# Altium footprint library 排针-排母-1.27.PcbLib: 152 footprints (part 7 of 10)
Each footprint in its own frame and in the unit in brackets; x right, y up, seen from the top. Pads: shape width x height; smd on the part's side, far side on the other; paste and mask are expansions set on the pad; w line width, h text height; cw(c..) or ccw(c..) is an arc to the next point about the centre after c.
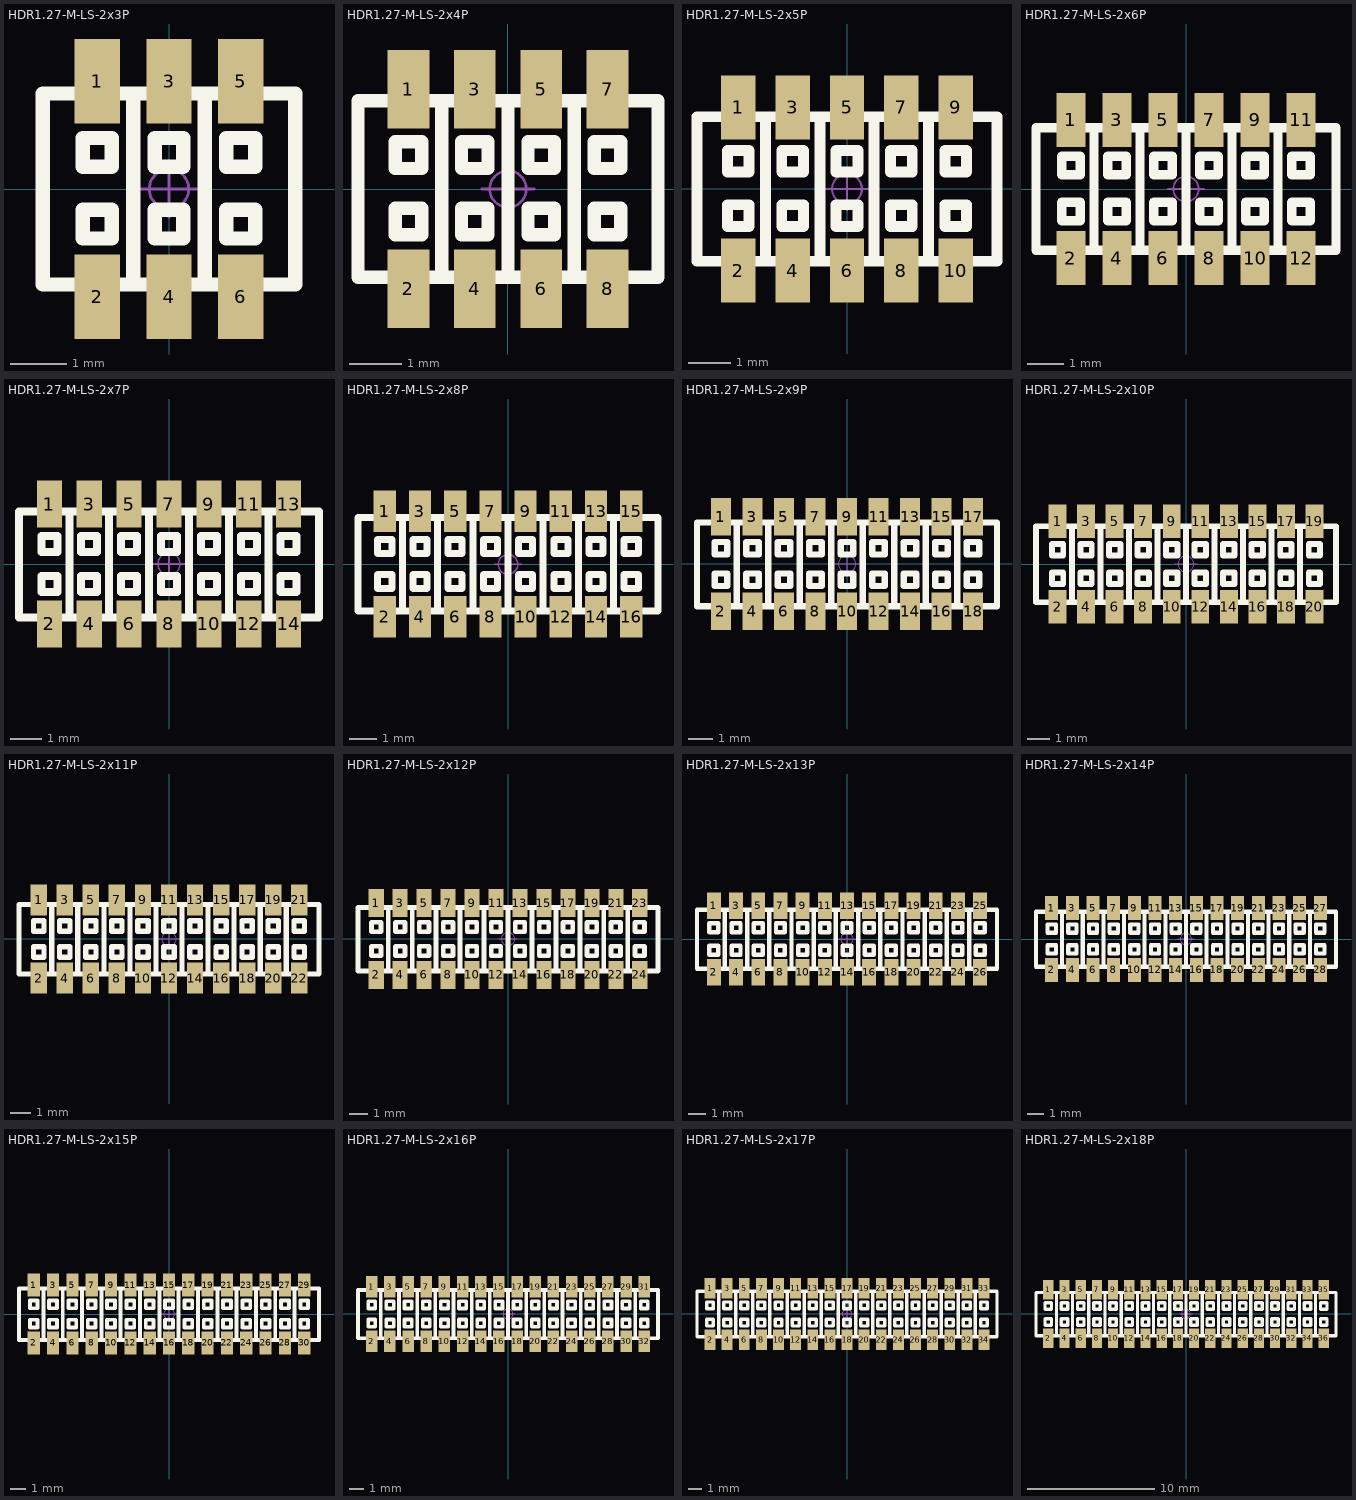
[diagram p6: the footprints below, top view; thin cyan lines are the x and y axes]

## HDR1.27-M-LS-2x3P [mm] "双排贴片排母，脚距：1.27mm"
pads (6):
  rect 0.8x1.5 smd: 1(-1.27,1.905) 2(-1.27,-1.905) 3(0,1.905) 4(0,-1.905) 5(1.27,1.905) 6(1.27,-1.905)
Top Overlay:
  lines w0.254: -0.635,-1.689 -0.635,1.689 ; 0.635,-1.689 0.635,1.689 ; -2.235,-1.689 -2.235,1.689 2.235,1.689 2.235,-1.689 -2.235,-1.689 ; -1.524,-0.876 -1.016,-0.876 -1.016,-0.368 -1.524,-0.368 -1.524,-0.876 ; -1.524,0.394 -1.524,0.902 -1.016,0.902 -1.016,0.394 -1.524,0.394 ; -0.254,-0.876 -0.254,-0.368 0.254,-0.368 0.254,-0.876 -0.254,-0.876 ; -0.254,0.394 0.254,0.394 0.254,0.902 -0.254,0.902 -0.254,0.394 ; 1.016,-0.876 1.524,-0.876 1.524,-0.368 1.016,-0.368 1.016,-0.876 ; 1.016,0.394 1.016,0.902 1.524,0.902 1.524,0.394 1.016,0.394
Mechanical 15:
  circle w0.05: c0,0 r0.35
  lines w0.05: -0.5,0 0.5,0 ; 0,-0.5 0,0.5
3D body: height 4.67, standoff 0, extent -0.635,-2.4 0.635,2.4
3D body: height 4.67, standoff 0, extent -2.105,-2.4 -0.635,2.4
3D body: height 4.67, standoff 0, extent 0.635,-2.4 2.105,2.4

## HDR1.27-M-LS-2x4P [mm] "双排贴片排母，脚距：1.27mm"
pads (8):
  rect 0.8x1.5 smd: 1(-1.905,1.905) 2(-1.905,-1.905) 3(-0.635,1.905) 4(-0.635,-1.905) 5(0.635,1.905) 6(0.635,-1.905) 7(1.905,1.905) 8(1.905,-1.905)
Top Overlay:
  lines w0.254: -1.27,-1.689 -1.27,1.689 ; 0,-1.689 0,1.689 ; 1.27,-1.689 1.27,1.689 ; -2.87,-1.689 -2.87,1.689 2.87,1.689 2.87,-1.689 -2.87,-1.689 ; -2.159,-0.876 -1.651,-0.876 -1.651,-0.368 -2.159,-0.368 -2.159,-0.876 ; -2.159,0.394 -2.159,0.902 -1.651,0.902 -1.651,0.394 -2.159,0.394 ; -0.889,-0.876 -0.889,-0.368 -0.381,-0.368 -0.381,-0.876 -0.889,-0.876 ; -0.889,0.394 -0.381,0.394 -0.381,0.902 -0.889,0.902 -0.889,0.394 ; 0.381,-0.876 0.381,-0.368 0.889,-0.368 0.889,-0.876 0.381,-0.876 ; 0.381,0.394 0.889,0.394 0.889,0.902 0.381,0.902 0.381,0.394 ; 1.651,-0.876 1.651,-0.368 2.159,-0.368 2.159,-0.876 1.651,-0.876 ; 1.651,0.394 2.159,0.394 2.159,0.902 1.651,0.902 1.651,0.394
Mechanical 15:
  circle w0.05: c0,0 r0.35
  lines w0.05: -0.5,0 0.5,0 ; 0,-0.5 0,0.5
3D body: height 4.67, standoff 0, extent 0,-2.4 1.27,2.4
3D body: height 4.67, standoff 0, extent -1.27,-2.4 0,2.4
3D body: height 4.67, standoff 0, extent -2.74,-2.4 -1.27,2.4
3D body: height 4.67, standoff 0, extent 1.27,-2.4 2.74,2.4

## HDR1.27-M-LS-2x5P [mm] "双排贴片排母，脚距：1.27mm"
pads (10):
  rect 0.8x1.5 smd: 1(-2.54,1.905) 2(-2.54,-1.905) 3(-1.27,1.905) 4(-1.27,-1.905) 5(0,1.905) 6(0,-1.905) 7(1.27,1.905) 8(1.27,-1.905) 9(2.54,1.905) 10(2.54,-1.905)
Top Overlay:
  lines w0.254: -1.905,-1.689 -1.905,1.689 ; -0.635,-1.689 -0.635,1.689 ; 0.635,-1.689 0.635,1.689 ; 1.905,-1.689 1.905,1.689 ; -3.505,-1.689 -3.505,1.689 3.505,1.689 3.505,-1.689 -3.505,-1.689 ; -2.794,-0.876 -2.286,-0.876 -2.286,-0.368 -2.794,-0.368 -2.794,-0.876 ; -2.794,0.394 -2.794,0.902 -2.286,0.902 -2.286,0.394 -2.794,0.394 ; -1.524,-0.876 -1.524,-0.368 -1.016,-0.368 -1.016,-0.876 -1.524,-0.876 ; -1.524,0.394 -1.016,0.394 -1.016,0.902 -1.524,0.902 -1.524,0.394 ; -0.254,-0.876 -0.254,-0.368 0.254,-0.368 0.254,-0.876 -0.254,-0.876 ; -0.254,0.394 0.254,0.394 0.254,0.902 -0.254,0.902 -0.254,0.394 ; 1.016,-0.876 1.016,-0.368 1.524,-0.368 1.524,-0.876 1.016,-0.876 ; 1.016,0.394 1.524,0.394 1.524,0.902 1.016,0.902 1.016,0.394 ; 2.286,-0.876 2.286,-0.368 2.794,-0.368 2.794,-0.876 2.286,-0.876 ; 2.286,0.394 2.794,0.394 2.794,0.902 2.286,0.902 2.286,0.394
Mechanical 15:
  circle w0.05: c0,0 r0.35
  lines w0.05: -0.5,0 0.5,0 ; 0,-0.5 0,0.5
3D body: height 4.67, standoff 0, extent -3.375,-2.4 -1.905,2.4
3D body: height 4.67, standoff 0, extent 1.905,-2.4 3.375,2.4
3D body: height 4.67, standoff 0, extent -1.905,-2.4 -0.635,2.4
3D body: height 4.67, standoff 0, extent -0.635,-2.4 0.635,2.4
3D body: height 4.67, standoff 0, extent 0.635,-2.4 1.905,2.4

## HDR1.27-M-LS-2x6P [mm] "双排贴片排母，脚距：1.27mm"
pads (12):
  rect 0.8x1.5 smd: 1(-3.175,1.905) 2(-3.175,-1.905) 3(-1.905,1.905) 4(-1.905,-1.905) 5(-0.635,1.905) 6(-0.635,-1.905) 7(0.635,1.905) 8(0.635,-1.905) 9(1.905,1.905) 10(1.905,-1.905) 11(3.175,1.905) 12(3.175,-1.905)
Top Overlay:
  lines w0.254: -2.54,-1.689 -2.54,1.689 ; -1.27,-1.689 -1.27,1.689 ; 0,-1.689 0,1.689 ; 1.27,-1.689 1.27,1.689 ; 2.54,-1.689 2.54,1.689 ; -4.14,-1.689 4.14,-1.689 4.14,1.689 -4.14,1.689 -4.14,-1.689 ; -3.429,-0.876 -3.429,-0.368 -2.921,-0.368 -2.921,-0.876 -3.429,-0.876 ; -3.429,0.394 -2.921,0.394 -2.921,0.902 -3.429,0.902 -3.429,0.394 ; -2.159,-0.876 -1.651,-0.876 -1.651,-0.368 -2.159,-0.368 -2.159,-0.876 ; -2.159,0.394 -2.159,0.902 -1.651,0.902 -1.651,0.394 -2.159,0.394 ; -0.889,-0.876 -0.381,-0.876 -0.381,-0.368 -0.889,-0.368 -0.889,-0.876 ; -0.889,0.394 -0.889,0.902 -0.381,0.902 -0.381,0.394 -0.889,0.394 ; 0.381,-0.876 0.889,-0.876 0.889,-0.368 0.381,-0.368 0.381,-0.876 ; 0.381,0.394 0.381,0.902 0.889,0.902 0.889,0.394 0.381,0.394 ; 1.651,-0.876 2.159,-0.876 2.159,-0.368 1.651,-0.368 1.651,-0.876 ; 1.651,0.394 1.651,0.902 2.159,0.902 2.159,0.394 1.651,0.394 ; 2.921,-0.876 3.429,-0.876 3.429,-0.368 2.921,-0.368 2.921,-0.876 ; 2.921,0.394 2.921,0.902 3.429,0.902 3.429,0.394 2.921,0.394
Mechanical 15:
  circle w0.05: c0,0 r0.35
  lines w0.05: -0.5,0 0.5,0 ; 0,-0.5 0,0.5
3D body: height 4.67, standoff 0, extent 2.54,-2.4 4.01,2.4
3D body: height 4.67, standoff 0, extent -4.01,-2.4 -2.54,2.4
3D body: height 4.67, standoff 0, extent -2.54,-2.4 -1.27,2.4
3D body: height 4.67, standoff 0, extent -1.27,-2.4 0,2.4
3D body: height 4.67, standoff 0, extent 0,-2.4 1.27,2.4
3D body: height 4.67, standoff 0, extent 1.27,-2.4 2.54,2.4

## HDR1.27-M-LS-2x7P [mm] "双排贴片排母，脚距：1.27mm"
pads (14):
  rect 0.8x1.5 smd: 1(-3.81,1.918) 2(-3.81,-1.892) 3(-2.54,1.918) 4(-2.54,-1.892) 5(-1.27,1.918) 6(-1.27,-1.892) 7(0,1.918) 8(0,-1.892) 9(1.27,1.918) 10(1.27,-1.892) 11(2.54,1.918) 12(2.54,-1.892) 13(3.81,1.918) 14(3.81,-1.892)
Top Overlay:
  lines w0.254: -3.175,-1.689 -3.175,1.689 ; -1.905,-1.689 -1.905,1.689 ; -0.635,-1.689 -0.635,1.689 ; 0.635,-1.689 0.635,1.689 ; 1.905,-1.689 1.905,1.689 ; 3.175,-1.689 3.175,1.689 ; -4.775,-1.689 4.775,-1.689 4.775,1.689 -4.775,1.689 -4.775,-1.689 ; -4.064,-0.876 -4.064,-0.368 -3.556,-0.368 -3.556,-0.876 -4.064,-0.876 ; -4.064,0.394 -3.556,0.394 -3.556,0.902 -4.064,0.902 -4.064,0.394 ; -2.794,-0.876 -2.286,-0.876 -2.286,-0.368 -2.794,-0.368 -2.794,-0.876 ; -2.794,0.394 -2.794,0.902 -2.286,0.902 -2.286,0.394 -2.794,0.394 ; -1.524,-0.876 -1.016,-0.876 -1.016,-0.368 -1.524,-0.368 -1.524,-0.876 ; -1.524,0.394 -1.524,0.902 -1.016,0.902 -1.016,0.394 -1.524,0.394 ; -0.254,-0.876 0.254,-0.876 0.254,-0.368 -0.254,-0.368 -0.254,-0.876 ; -0.254,0.394 -0.254,0.902 0.254,0.902 0.254,0.394 -0.254,0.394 ; 1.016,-0.876 1.524,-0.876 1.524,-0.368 1.016,-0.368 1.016,-0.876 ; 1.016,0.394 1.016,0.902 1.524,0.902 1.524,0.394 1.016,0.394 ; 2.286,-0.876 2.794,-0.876 2.794,-0.368 2.286,-0.368 2.286,-0.876 ; 2.286,0.394 2.286,0.902 2.794,0.902 2.794,0.394 2.286,0.394 ; 3.556,-0.876 4.064,-0.876 4.064,-0.368 3.556,-0.368 3.556,-0.876 ; 3.556,0.394 3.556,0.902 4.064,0.902 4.064,0.394 3.556,0.394
Mechanical 15:
  circle w0.05: c0,0.013 r0.35
  lines w0.05: -0.5,0.013 0.5,0.013 ; 0,-0.487 0,0.513
3D body: height 4.67, standoff 0, extent 1.905,-2.387 3.175,2.413
3D body: height 4.67, standoff 0, extent 0.635,-2.387 1.905,2.413
3D body: height 4.67, standoff 0, extent -0.635,-2.387 0.635,2.413
3D body: height 4.67, standoff 0, extent -1.905,-2.387 -0.635,2.413
3D body: height 4.67, standoff 0, extent -3.175,-2.387 -1.905,2.413
3D body: height 4.67, standoff 0, extent -4.645,-2.387 -3.175,2.413
3D body: height 4.67, standoff 0, extent 3.175,-2.387 4.645,2.413

## HDR1.27-M-LS-2x8P [mm] "双排贴片排母，脚距：1.27mm"
pads (16):
  rect 0.8x1.5 smd: 1(-4.445,1.918) 2(-4.445,-1.892) 3(-3.175,1.918) 4(-3.175,-1.892) 5(-1.905,1.918) 6(-1.905,-1.892) 7(-0.635,1.918) 8(-0.635,-1.892) 9(0.635,1.918) 10(0.635,-1.892) 11(1.905,1.918) 12(1.905,-1.892) 13(3.175,1.918) 14(3.175,-1.892) 15(4.445,1.918) 16(4.445,-1.892)
Top Overlay:
  lines w0.254: -3.81,-1.689 -3.81,1.689 ; -2.54,-1.689 -2.54,1.689 ; -1.27,-1.689 -1.27,1.689 ; 0,-1.689 0,1.689 ; 1.27,-1.689 1.27,1.689 ; 2.54,-1.689 2.54,1.689 ; 3.81,-1.689 3.81,1.689 ; -5.41,-1.689 5.41,-1.689 5.41,1.689 -5.41,1.689 -5.41,-1.689 ; -4.699,-0.876 -4.699,-0.368 -4.191,-0.368 -4.191,-0.876 -4.699,-0.876 ; -4.699,0.394 -4.191,0.394 -4.191,0.902 -4.699,0.902 -4.699,0.394 ; -3.429,-0.876 -2.921,-0.876 -2.921,-0.368 -3.429,-0.368 -3.429,-0.876 ; -3.429,0.394 -3.429,0.902 -2.921,0.902 -2.921,0.394 -3.429,0.394 ; -2.159,-0.876 -1.651,-0.876 -1.651,-0.368 -2.159,-0.368 -2.159,-0.876 ; -2.159,0.394 -2.159,0.902 -1.651,0.902 -1.651,0.394 -2.159,0.394 ; -0.889,-0.876 -0.381,-0.876 -0.381,-0.368 -0.889,-0.368 -0.889,-0.876 ; -0.889,0.394 -0.889,0.902 -0.381,0.902 -0.381,0.394 -0.889,0.394 ; 0.381,-0.876 0.889,-0.876 0.889,-0.368 0.381,-0.368 0.381,-0.876 ; 0.381,0.394 0.381,0.902 0.889,0.902 0.889,0.394 0.381,0.394 ; 1.651,-0.876 2.159,-0.876 2.159,-0.368 1.651,-0.368 1.651,-0.876 ; 1.651,0.394 1.651,0.902 2.159,0.902 2.159,0.394 1.651,0.394 ; 2.921,-0.876 3.429,-0.876 3.429,-0.368 2.921,-0.368 2.921,-0.876 ; 2.921,0.394 2.921,0.902 3.429,0.902 3.429,0.394 2.921,0.394 ; 4.191,-0.876 4.699,-0.876 4.699,-0.368 4.191,-0.368 4.191,-0.876 ; 4.191,0.394 4.191,0.902 4.699,0.902 4.699,0.394 4.191,0.394
Mechanical 15:
  circle w0.05: c0,0 r0.35
  lines w0.05: -0.5,0 0.5,0 ; 0,-0.5 0,0.5
3D body: height 4.67, standoff 0, extent 2.54,-2.387 3.81,2.413
3D body: height 4.67, standoff 0, extent 1.27,-2.387 2.54,2.413
3D body: height 4.67, standoff 0, extent 0,-2.387 1.27,2.413
3D body: height 4.67, standoff 0, extent -1.27,-2.387 0,2.413
3D body: height 4.67, standoff 0, extent -2.54,-2.387 -1.27,2.413
3D body: height 4.67, standoff 0, extent -3.81,-2.387 -2.54,2.413
3D body: height 4.67, standoff 0, extent 3.81,-2.387 5.28,2.413
3D body: height 4.67, standoff 0, extent -5.28,-2.387 -3.81,2.413

## HDR1.27-M-LS-2x9P [mm] "双排贴片排母，脚距：1.27mm"
pads (18):
  rect 0.8x1.5 smd: 1(-5.08,1.905) 2(-5.08,-1.905) 3(-3.81,1.905) 4(-3.81,-1.905) 5(-2.54,1.905) 6(-2.54,-1.905) 7(-1.27,1.905) 8(-1.27,-1.905) 9(0,1.905) 10(0,-1.905) 11(1.27,1.905) 12(1.27,-1.905) 13(2.54,1.905) 14(2.54,-1.905) 15(3.81,1.905) 16(3.81,-1.905) 17(5.08,1.905) 18(5.08,-1.905)
Top Overlay:
  lines w0.254: -4.445,-1.702 -4.445,1.676 ; -3.175,-1.702 -3.175,1.676 ; -1.905,-1.702 -1.905,1.676 ; -0.635,-1.702 -0.635,1.676 ; 0.635,-1.702 0.635,1.676 ; 1.905,-1.702 1.905,1.676 ; 3.175,-1.702 3.175,1.676 ; 4.445,-1.702 4.445,1.676 ; -6.045,-1.702 -6.045,1.676 6.045,1.676 6.045,-1.702 -6.045,-1.702 ; -5.334,-0.889 -4.826,-0.889 -4.826,-0.381 -5.334,-0.381 -5.334,-0.889 ; -5.334,0.381 -5.334,0.889 -4.826,0.889 -4.826,0.381 -5.334,0.381 ; -4.064,-0.889 -4.064,-0.381 -3.556,-0.381 -3.556,-0.889 -4.064,-0.889 ; -4.064,0.381 -3.556,0.381 -3.556,0.889 -4.064,0.889 -4.064,0.381 ; -2.794,-0.889 -2.794,-0.381 -2.286,-0.381 -2.286,-0.889 -2.794,-0.889 ; -2.794,0.381 -2.286,0.381 -2.286,0.889 -2.794,0.889 -2.794,0.381 ; -1.524,-0.889 -1.524,-0.381 -1.016,-0.381 -1.016,-0.889 -1.524,-0.889 ; -1.524,0.381 -1.016,0.381 -1.016,0.889 -1.524,0.889 -1.524,0.381 ; -0.254,-0.889 -0.254,-0.381 0.254,-0.381 0.254,-0.889 -0.254,-0.889 ; -0.254,0.381 0.254,0.381 0.254,0.889 -0.254,0.889 -0.254,0.381 ; 1.016,-0.889 1.016,-0.381 1.524,-0.381 1.524,-0.889 1.016,-0.889 ; 1.016,0.381 1.524,0.381 1.524,0.889 1.016,0.889 1.016,0.381 ; 2.286,-0.889 2.286,-0.381 2.794,-0.381 2.794,-0.889 2.286,-0.889 ; 2.286,0.381 2.794,0.381 2.794,0.889 2.286,0.889 2.286,0.381 ; 3.556,-0.889 3.556,-0.381 4.064,-0.381 4.064,-0.889 3.556,-0.889 ; 3.556,0.381 4.064,0.381 4.064,0.889 3.556,0.889 3.556,0.381 ; 4.826,-0.889 4.826,-0.381 5.334,-0.381 5.334,-0.889 4.826,-0.889 ; 4.826,0.381 5.334,0.381 5.334,0.889 4.826,0.889 4.826,0.381
Mechanical 15:
  circle w0.05: c0,0 r0.35
  lines w0.05: -0.5,0 0.5,0 ; 0,-0.5 0,0.5
3D body: height 4.67, standoff 0, extent -5.915,-2.4 -4.445,2.4
3D body: height 4.67, standoff 0, extent 4.445,-2.4 5.915,2.4
3D body: height 4.67, standoff 0, extent -4.445,-2.4 -3.175,2.4
3D body: height 4.67, standoff 0, extent -3.175,-2.4 -1.905,2.4
3D body: height 4.67, standoff 0, extent -1.905,-2.4 -0.635,2.4
3D body: height 4.67, standoff 0, extent -0.635,-2.4 0.635,2.4
3D body: height 4.67, standoff 0, extent 0.635,-2.4 1.905,2.4
3D body: height 4.67, standoff 0, extent 1.905,-2.4 3.175,2.4
3D body: height 4.67, standoff 0, extent 3.175,-2.4 4.445,2.4

## HDR1.27-M-LS-2x10P [mm] "双排贴片排母，脚距：1.27mm"
pads (20):
  rect 0.8x1.5 smd: 1(-5.715,1.918) 2(-5.715,-1.892) 3(-4.445,1.918) 4(-4.445,-1.892) 5(-3.175,1.918) 6(-3.175,-1.892) 7(-1.905,1.918) 8(-1.905,-1.892) 9(-0.635,1.918) 10(-0.635,-1.892) 11(0.635,1.918) 12(0.635,-1.892) 13(1.905,1.918) 14(1.905,-1.892) 15(3.175,1.918) 16(3.175,-1.892) 17(4.445,1.918) 18(4.445,-1.892) 19(5.715,1.918) 20(5.715,-1.892)
Top Overlay:
  lines w0.254: -5.08,-1.689 -5.08,1.689 ; -3.81,-1.689 -3.81,1.689 ; -2.54,-1.689 -2.54,1.689 ; -1.27,-1.689 -1.27,1.689 ; 0,-1.689 0,1.689 ; 1.27,-1.689 1.27,1.689 ; 2.54,-1.689 2.54,1.689 ; 3.81,-1.689 3.81,1.689 ; 5.08,-1.689 5.08,1.689 ; -6.68,-1.689 6.68,-1.689 6.68,1.689 -6.68,1.689 -6.68,-1.689 ; -5.969,-0.876 -5.969,-0.368 -5.461,-0.368 -5.461,-0.876 -5.969,-0.876 ; -5.969,0.394 -5.461,0.394 -5.461,0.902 -5.969,0.902 -5.969,0.394 ; -4.699,-0.876 -4.191,-0.876 -4.191,-0.368 -4.699,-0.368 -4.699,-0.876 ; -4.699,0.394 -4.699,0.902 -4.191,0.902 -4.191,0.394 -4.699,0.394 ; -3.429,-0.876 -2.921,-0.876 -2.921,-0.368 -3.429,-0.368 -3.429,-0.876 ; -3.429,0.394 -3.429,0.902 -2.921,0.902 -2.921,0.394 -3.429,0.394 ; -2.159,-0.876 -1.651,-0.876 -1.651,-0.368 -2.159,-0.368 -2.159,-0.876 ; -2.159,0.394 -2.159,0.902 -1.651,0.902 -1.651,0.394 -2.159,0.394 ; -0.889,-0.876 -0.381,-0.876 -0.381,-0.368 -0.889,-0.368 -0.889,-0.876 ; -0.889,0.394 -0.889,0.902 -0.381,0.902 -0.381,0.394 -0.889,0.394 ; 0.381,-0.876 0.889,-0.876 0.889,-0.368 0.381,-0.368 0.381,-0.876 ; 0.381,0.394 0.381,0.902 0.889,0.902 0.889,0.394 0.381,0.394 ; 1.651,-0.876 2.159,-0.876 2.159,-0.368 1.651,-0.368 1.651,-0.876 ; 1.651,0.394 1.651,0.902 2.159,0.902 2.159,0.394 1.651,0.394 ; 2.921,-0.876 3.429,-0.876 3.429,-0.368 2.921,-0.368 2.921,-0.876 ; 2.921,0.394 2.921,0.902 3.429,0.902 3.429,0.394 2.921,0.394 ; 4.191,-0.876 4.699,-0.876 4.699,-0.368 4.191,-0.368 4.191,-0.876 ; 4.191,0.394 4.191,0.902 4.699,0.902 4.699,0.394 4.191,0.394 ; 5.461,-0.876 5.969,-0.876 5.969,-0.368 5.461,-0.368 5.461,-0.876 ; 5.461,0.394 5.461,0.902 5.969,0.902 5.969,0.394 5.461,0.394
Mechanical 15:
  circle w0.05: c0,0.013 r0.35
  lines w0.05: -0.5,0.013 0.5,0.013 ; 0,-0.487 0,0.513
3D body: height 4.67, standoff 0, extent 3.81,-2.387 5.08,2.413
3D body: height 4.67, standoff 0, extent 2.54,-2.387 3.81,2.413
3D body: height 4.67, standoff 0, extent 1.27,-2.387 2.54,2.413
3D body: height 4.67, standoff 0, extent 0,-2.387 1.27,2.413
3D body: height 4.67, standoff 0, extent -1.27,-2.387 0,2.413
3D body: height 4.67, standoff 0, extent -2.54,-2.387 -1.27,2.413
3D body: height 4.67, standoff 0, extent -3.81,-2.387 -2.54,2.413
3D body: height 4.67, standoff 0, extent -5.08,-2.387 -3.81,2.413
3D body: height 4.67, standoff 0, extent -6.55,-2.387 -5.08,2.413
3D body: height 4.67, standoff 0, extent 5.08,-2.387 6.55,2.413

## HDR1.27-M-LS-2x11P [mm] "双排贴片排母，脚距：1.27mm"
pads (22):
  rect 0.8x1.5 smd: 1(-6.35,1.905) 2(-6.35,-1.905) 3(-5.08,1.905) 4(-5.08,-1.905) 5(-3.81,1.905) 6(-3.81,-1.905) 7(-2.54,1.905) 8(-2.54,-1.905) 9(-1.27,1.905) 10(-1.27,-1.905) 11(0,1.905) 12(0,-1.905) 13(1.27,1.905) 14(1.27,-1.905) 15(2.54,1.905) 16(2.54,-1.905) 17(3.81,1.905) 18(3.81,-1.905) 19(5.08,1.905) 20(5.08,-1.905) 21(6.35,1.905) 22(6.35,-1.905)
Top Overlay:
  lines w0.254: -5.715,-1.702 -5.715,1.676 ; -4.445,-1.702 -4.445,1.676 ; -3.175,-1.702 -3.175,1.676 ; -1.905,-1.702 -1.905,1.676 ; -0.635,-1.702 -0.635,1.676 ; 0.635,-1.702 0.635,1.676 ; 1.905,-1.702 1.905,1.676 ; 3.175,-1.702 3.175,1.676 ; 4.445,-1.702 4.445,1.676 ; 5.715,-1.702 5.715,1.676 ; -7.315,-1.702 -7.315,1.676 7.315,1.676 7.315,-1.702 -7.315,-1.702 ; -6.604,-0.889 -6.096,-0.889 -6.096,-0.381 -6.604,-0.381 -6.604,-0.889 ; -6.604,0.381 -6.604,0.889 -6.096,0.889 -6.096,0.381 -6.604,0.381 ; -5.334,-0.889 -5.334,-0.381 -4.826,-0.381 -4.826,-0.889 -5.334,-0.889 ; -5.334,0.381 -4.826,0.381 -4.826,0.889 -5.334,0.889 -5.334,0.381 ; -4.064,-0.889 -4.064,-0.381 -3.556,-0.381 -3.556,-0.889 -4.064,-0.889 ; -4.064,0.381 -3.556,0.381 -3.556,0.889 -4.064,0.889 -4.064,0.381 ; -2.794,-0.889 -2.794,-0.381 -2.286,-0.381 -2.286,-0.889 -2.794,-0.889 ; -2.794,0.381 -2.286,0.381 -2.286,0.889 -2.794,0.889 -2.794,0.381 ; -1.524,-0.889 -1.524,-0.381 -1.016,-0.381 -1.016,-0.889 -1.524,-0.889 ; -1.524,0.381 -1.016,0.381 -1.016,0.889 -1.524,0.889 -1.524,0.381 ; -0.254,-0.889 -0.254,-0.381 0.254,-0.381 0.254,-0.889 -0.254,-0.889 ; -0.254,0.381 0.254,0.381 0.254,0.889 -0.254,0.889 -0.254,0.381 ; 1.016,-0.889 1.016,-0.381 1.524,-0.381 1.524,-0.889 1.016,-0.889 ; 1.016,0.381 1.524,0.381 1.524,0.889 1.016,0.889 1.016,0.381 ; 2.286,-0.889 2.286,-0.381 2.794,-0.381 2.794,-0.889 2.286,-0.889 ; 2.286,0.381 2.794,0.381 2.794,0.889 2.286,0.889 2.286,0.381 ; 3.556,-0.889 3.556,-0.381 4.064,-0.381 4.064,-0.889 3.556,-0.889 ; 3.556,0.381 4.064,0.381 4.064,0.889 3.556,0.889 3.556,0.381 ; 4.826,-0.889 4.826,-0.381 5.334,-0.381 5.334,-0.889 4.826,-0.889 ; 4.826,0.381 5.334,0.381 5.334,0.889 4.826,0.889 4.826,0.381 ; 6.096,-0.889 6.096,-0.381 6.604,-0.381 6.604,-0.889 6.096,-0.889 ; 6.096,0.381 6.604,0.381 6.604,0.889 6.096,0.889 6.096,0.381
Mechanical 15:
  circle w0.05: c0,0 r0.35
  lines w0.05: -0.5,0 0.5,0 ; 0,-0.5 0,0.5
3D body: height 4.67, standoff 0, extent 4.445,-2.4 5.715,2.4
3D body: height 4.67, standoff 0, extent 3.175,-2.4 4.445,2.4
3D body: height 4.67, standoff 0, extent 1.905,-2.4 3.175,2.4
3D body: height 4.67, standoff 0, extent 0.635,-2.4 1.905,2.4
3D body: height 4.67, standoff 0, extent -0.635,-2.4 0.635,2.4
3D body: height 4.67, standoff 0, extent -1.905,-2.4 -0.635,2.4
3D body: height 4.67, standoff 0, extent -3.175,-2.4 -1.905,2.4
3D body: height 4.67, standoff 0, extent -4.445,-2.4 -3.175,2.4
3D body: height 4.67, standoff 0, extent -5.715,-2.4 -4.445,2.4
3D body: height 4.67, standoff 0, extent -7.185,-2.4 -5.715,2.4
3D body: height 4.67, standoff 0, extent 5.715,-2.4 7.185,2.4

## HDR1.27-M-LS-2x12P [mm] "双排贴片排母，脚距：1.27mm"
pads (24):
  rect 0.8x1.5 smd: 1(-6.985,1.905) 2(-6.985,-1.905) 3(-5.715,1.905) 4(-5.715,-1.905) 5(-4.445,1.905) 6(-4.445,-1.905) 7(-3.175,1.905) 8(-3.175,-1.905) 9(-1.905,1.905) 10(-1.905,-1.905) 11(-0.635,1.905) 12(-0.635,-1.905) 13(0.635,1.905) 14(0.635,-1.905) 15(1.905,1.905) 16(1.905,-1.905) 17(3.175,1.905) 18(3.175,-1.905) 19(4.445,1.905) 20(4.445,-1.905) 21(5.715,1.905) 22(5.715,-1.905) 23(6.985,1.905) 24(6.985,-1.905)
Top Overlay:
  lines w0.254: -6.35,-1.702 -6.35,1.676 ; -5.08,-1.702 -5.08,1.676 ; -3.81,-1.702 -3.81,1.676 ; -2.54,-1.702 -2.54,1.676 ; -1.27,-1.702 -1.27,1.676 ; 0,-1.702 0,1.676 ; 1.27,-1.702 1.27,1.676 ; 2.54,-1.702 2.54,1.676 ; 3.81,-1.702 3.81,1.676 ; 5.08,-1.702 5.08,1.676 ; 6.35,-1.702 6.35,1.676 ; -7.95,-1.702 7.95,-1.702 7.95,1.676 -7.95,1.676 -7.95,-1.702 ; -7.239,-0.889 -7.239,-0.381 -6.731,-0.381 -6.731,-0.889 -7.239,-0.889 ; -7.239,0.381 -6.731,0.381 -6.731,0.889 -7.239,0.889 -7.239,0.381 ; -5.969,-0.889 -5.461,-0.889 -5.461,-0.381 -5.969,-0.381 -5.969,-0.889 ; -5.969,0.381 -5.969,0.889 -5.461,0.889 -5.461,0.381 -5.969,0.381 ; -4.699,-0.889 -4.191,-0.889 -4.191,-0.381 -4.699,-0.381 -4.699,-0.889 ; -4.699,0.381 -4.699,0.889 -4.191,0.889 -4.191,0.381 -4.699,0.381 ; -3.429,-0.889 -2.921,-0.889 -2.921,-0.381 -3.429,-0.381 -3.429,-0.889 ; -3.429,0.381 -3.429,0.889 -2.921,0.889 -2.921,0.381 -3.429,0.381 ; -2.159,-0.889 -1.651,-0.889 -1.651,-0.381 -2.159,-0.381 -2.159,-0.889 ; -2.159,0.381 -2.159,0.889 -1.651,0.889 -1.651,0.381 -2.159,0.381 ; -0.889,-0.889 -0.381,-0.889 -0.381,-0.381 -0.889,-0.381 -0.889,-0.889 ; -0.889,0.381 -0.889,0.889 -0.381,0.889 -0.381,0.381 -0.889,0.381 ; 0.381,-0.889 0.889,-0.889 0.889,-0.381 0.381,-0.381 0.381,-0.889 ; 0.381,0.381 0.381,0.889 0.889,0.889 0.889,0.381 0.381,0.381 ; 1.651,-0.889 2.159,-0.889 2.159,-0.381 1.651,-0.381 1.651,-0.889 ; 1.651,0.381 1.651,0.889 2.159,0.889 2.159,0.381 1.651,0.381 ; 2.921,-0.889 3.429,-0.889 3.429,-0.381 2.921,-0.381 2.921,-0.889 ; 2.921,0.381 2.921,0.889 3.429,0.889 3.429,0.381 2.921,0.381 ; 4.191,-0.889 4.699,-0.889 4.699,-0.381 4.191,-0.381 4.191,-0.889 ; 4.191,0.381 4.191,0.889 4.699,0.889 4.699,0.381 4.191,0.381 ; 5.461,-0.889 5.969,-0.889 5.969,-0.381 5.461,-0.381 5.461,-0.889 ; 5.461,0.381 5.461,0.889 5.969,0.889 5.969,0.381 5.461,0.381 ; 6.731,-0.889 7.239,-0.889 7.239,-0.381 6.731,-0.381 6.731,-0.889 ; 6.731,0.381 6.731,0.889 7.239,0.889 7.239,0.381 6.731,0.381
Mechanical 15:
  circle w0.05: c0,0 r0.35
  lines w0.05: -0.5,0 0.5,0 ; 0,-0.5 0,0.5
3D body: height 4.67, standoff 0, extent 5.08,-2.4 6.35,2.4
3D body: height 4.67, standoff 0, extent 3.81,-2.4 5.08,2.4
3D body: height 4.67, standoff 0, extent 2.54,-2.4 3.81,2.4
3D body: height 4.67, standoff 0, extent 1.27,-2.4 2.54,2.4
3D body: height 4.67, standoff 0, extent 0,-2.4 1.27,2.4
3D body: height 4.67, standoff 0, extent -1.27,-2.4 0,2.4
3D body: height 4.67, standoff 0, extent -2.54,-2.4 -1.27,2.4
3D body: height 4.67, standoff 0, extent -3.81,-2.4 -2.54,2.4
3D body: height 4.67, standoff 0, extent -5.08,-2.4 -3.81,2.4
3D body: height 4.67, standoff 0, extent -6.35,-2.4 -5.08,2.4
3D body: height 4.67, standoff 0, extent -7.82,-2.4 -6.35,2.4
3D body: height 4.67, standoff 0, extent 6.35,-2.4 7.82,2.4

## HDR1.27-M-LS-2x13P [mm] "双排贴片排母，脚距：1.27mm"
pads (26):
  rect 0.8x1.5 smd: 1(-7.62,1.918) 2(-7.62,-1.892) 3(-6.35,1.918) 4(-6.35,-1.892) 5(-5.08,1.918) 6(-5.08,-1.892) 7(-3.81,1.918) 8(-3.81,-1.892) 9(-2.54,1.918) 10(-2.54,-1.892) 11(-1.27,1.918) 12(-1.27,-1.892) 13(0,1.918) 14(0,-1.892) 15(1.27,1.918) 16(1.27,-1.892) 17(2.54,1.918) 18(2.54,-1.892) 19(3.81,1.918) 20(3.81,-1.892) 21(5.08,1.918) 22(5.08,-1.892) 23(6.35,1.918) 24(6.35,-1.892) 25(7.62,1.918) 26(7.62,-1.892)
Top Overlay:
  lines w0.254: -6.985,-1.689 -6.985,1.689 ; -5.715,-1.689 -5.715,1.689 ; -4.445,-1.689 -4.445,1.689 ; -3.175,-1.689 -3.175,1.689 ; -1.905,-1.689 -1.905,1.689 ; -0.635,-1.689 -0.635,1.689 ; 0.635,-1.689 0.635,1.689 ; 1.905,-1.689 1.905,1.689 ; 3.175,-1.689 3.175,1.689 ; 4.445,-1.689 4.445,1.689 ; 5.715,-1.689 5.715,1.689 ; 6.985,-1.689 6.985,1.689 ; -8.585,-1.689 8.585,-1.689 8.585,1.689 -8.585,1.689 -8.585,-1.689 ; -7.874,-0.876 -7.874,-0.368 -7.366,-0.368 -7.366,-0.876 -7.874,-0.876 ; -7.874,0.394 -7.366,0.394 -7.366,0.902 -7.874,0.902 -7.874,0.394 ; -6.604,-0.876 -6.096,-0.876 -6.096,-0.368 -6.604,-0.368 -6.604,-0.876 ; -6.604,0.394 -6.604,0.902 -6.096,0.902 -6.096,0.394 -6.604,0.394 ; -5.334,-0.876 -4.826,-0.876 -4.826,-0.368 -5.334,-0.368 -5.334,-0.876 ; -5.334,0.394 -5.334,0.902 -4.826,0.902 -4.826,0.394 -5.334,0.394 ; -4.064,-0.876 -3.556,-0.876 -3.556,-0.368 -4.064,-0.368 -4.064,-0.876 ; -4.064,0.394 -4.064,0.902 -3.556,0.902 -3.556,0.394 -4.064,0.394 ; -2.794,-0.876 -2.286,-0.876 -2.286,-0.368 -2.794,-0.368 -2.794,-0.876 ; -2.794,0.394 -2.794,0.902 -2.286,0.902 -2.286,0.394 -2.794,0.394 ; -1.524,-0.876 -1.016,-0.876 -1.016,-0.368 -1.524,-0.368 -1.524,-0.876 ; -1.524,0.394 -1.524,0.902 -1.016,0.902 -1.016,0.394 -1.524,0.394 ; -0.254,-0.876 0.254,-0.876 0.254,-0.368 -0.254,-0.368 -0.254,-0.876 ; -0.254,0.394 -0.254,0.902 0.254,0.902 0.254,0.394 -0.254,0.394 ; 1.016,-0.876 1.524,-0.876 1.524,-0.368 1.016,-0.368 1.016,-0.876 ; 1.016,0.394 1.016,0.902 1.524,0.902 1.524,0.394 1.016,0.394 ; 2.286,-0.876 2.794,-0.876 2.794,-0.368 2.286,-0.368 2.286,-0.876 ; 2.286,0.394 2.286,0.902 2.794,0.902 2.794,0.394 2.286,0.394 ; 3.556,-0.876 4.064,-0.876 4.064,-0.368 3.556,-0.368 3.556,-0.876 ; 3.556,0.394 3.556,0.902 4.064,0.902 4.064,0.394 3.556,0.394 ; 4.826,-0.876 5.334,-0.876 5.334,-0.368 4.826,-0.368 4.826,-0.876 ; 4.826,0.394 4.826,0.902 5.334,0.902 5.334,0.394 4.826,0.394 ; 6.096,-0.876 6.604,-0.876 6.604,-0.368 6.096,-0.368 6.096,-0.876 ; 6.096,0.394 6.096,0.902 6.604,0.902 6.604,0.394 6.096,0.394 ; 7.366,-0.876 7.874,-0.876 7.874,-0.368 7.366,-0.368 7.366,-0.876 ; 7.366,0.394 7.366,0.902 7.874,0.902 7.874,0.394 7.366,0.394
Mechanical 15:
  circle w0.05: c0,0.013 r0.35
  lines w0.05: -0.5,0.013 0.5,0.013 ; 0,-0.487 0,0.513
3D body: height 4.67, standoff 0, extent 5.715,-2.387 6.985,2.413
3D body: height 4.67, standoff 0, extent 4.445,-2.387 5.715,2.413
3D body: height 4.67, standoff 0, extent 3.175,-2.387 4.445,2.413
3D body: height 4.67, standoff 0, extent 6.985,-2.387 8.455,2.413
3D body: height 4.67, standoff 0, extent -8.455,-2.387 -6.985,2.413
3D body: height 4.67, standoff 0, extent -6.985,-2.387 -5.715,2.413
3D body: height 4.67, standoff 0, extent -5.715,-2.387 -4.445,2.413
3D body: height 4.67, standoff 0, extent -4.445,-2.387 -3.175,2.413
3D body: height 4.67, standoff 0, extent -3.175,-2.387 -1.905,2.413
3D body: height 4.67, standoff 0, extent -1.905,-2.387 -0.635,2.413
3D body: height 4.67, standoff 0, extent -0.635,-2.387 0.635,2.413
3D body: height 4.67, standoff 0, extent 0.635,-2.387 1.905,2.413
3D body: height 4.67, standoff 0, extent 1.905,-2.387 3.175,2.413

## HDR1.27-M-LS-2x14P [mm] "双排贴片排母，脚距：1.27mm"
pads (28):
  rect 0.8x1.5 smd: 1(-8.255,1.918) 2(-8.255,-1.892) 3(-6.985,1.918) 4(-6.985,-1.892) 5(-5.715,1.918) 6(-5.715,-1.892) 7(-4.445,1.918) 8(-4.445,-1.892) 9(-3.175,1.918) 10(-3.175,-1.892) 11(-1.905,1.918) 12(-1.905,-1.892) 13(-0.635,1.918) 14(-0.635,-1.892) 15(0.635,1.918) 16(0.635,-1.892) 17(1.905,1.918) 18(1.905,-1.892) 19(3.175,1.918) 20(3.175,-1.892) 21(4.445,1.918) 22(4.445,-1.892) 23(5.715,1.918) 24(5.715,-1.892) 25(6.985,1.918) 26(6.985,-1.892) 27(8.255,1.918) 28(8.255,-1.892)
Top Overlay:
  lines w0.254: -7.62,-1.689 -7.62,1.689 ; -6.35,-1.689 -6.35,1.689 ; -5.08,-1.689 -5.08,1.689 ; -3.81,-1.689 -3.81,1.689 ; -2.54,-1.689 -2.54,1.689 ; -1.27,-1.689 -1.27,1.689 ; 0,-1.689 0,1.689 ; 1.27,-1.689 1.27,1.689 ; 2.54,-1.689 2.54,1.689 ; 3.81,-1.689 3.81,1.689 ; 5.08,-1.689 5.08,1.689 ; 6.35,-1.689 6.35,1.689 ; 7.62,-1.689 7.62,1.689 ; -9.22,-1.689 -9.22,1.689 9.22,1.689 9.22,-1.689 -9.22,-1.689 ; -8.509,-0.876 -8.001,-0.876 -8.001,-0.368 -8.509,-0.368 -8.509,-0.876 ; -8.509,0.394 -8.509,0.902 -8.001,0.902 -8.001,0.394 -8.509,0.394 ; -7.239,-0.876 -7.239,-0.368 -6.731,-0.368 -6.731,-0.876 -7.239,-0.876 ; -7.239,0.394 -6.731,0.394 -6.731,0.902 -7.239,0.902 -7.239,0.394 ; -5.969,-0.876 -5.969,-0.368 -5.461,-0.368 -5.461,-0.876 -5.969,-0.876 ; -5.969,0.394 -5.461,0.394 -5.461,0.902 -5.969,0.902 -5.969,0.394 ; -4.699,-0.876 -4.699,-0.368 -4.191,-0.368 -4.191,-0.876 -4.699,-0.876 ; -4.699,0.394 -4.191,0.394 -4.191,0.902 -4.699,0.902 -4.699,0.394 ; -3.429,-0.876 -3.429,-0.368 -2.921,-0.368 -2.921,-0.876 -3.429,-0.876 ; -3.429,0.394 -2.921,0.394 -2.921,0.902 -3.429,0.902 -3.429,0.394 ; -2.159,-0.876 -2.159,-0.368 -1.651,-0.368 -1.651,-0.876 -2.159,-0.876 ; -2.159,0.394 -1.651,0.394 -1.651,0.902 -2.159,0.902 -2.159,0.394 ; -0.889,-0.876 -0.889,-0.368 -0.381,-0.368 -0.381,-0.876 -0.889,-0.876 ; -0.889,0.394 -0.381,0.394 -0.381,0.902 -0.889,0.902 -0.889,0.394 ; 0.381,-0.876 0.381,-0.368 0.889,-0.368 0.889,-0.876 0.381,-0.876 ; 0.381,0.394 0.889,0.394 0.889,0.902 0.381,0.902 0.381,0.394 ; 1.651,-0.876 1.651,-0.368 2.159,-0.368 2.159,-0.876 1.651,-0.876 ; 1.651,0.394 2.159,0.394 2.159,0.902 1.651,0.902 1.651,0.394 ; 2.921,-0.876 2.921,-0.368 3.429,-0.368 3.429,-0.876 2.921,-0.876 ; 2.921,0.394 3.429,0.394 3.429,0.902 2.921,0.902 2.921,0.394 ; 4.191,-0.876 4.191,-0.368 4.699,-0.368 4.699,-0.876 4.191,-0.876 ; 4.191,0.394 4.699,0.394 4.699,0.902 4.191,0.902 4.191,0.394 ; 5.461,-0.876 5.461,-0.368 5.969,-0.368 5.969,-0.876 5.461,-0.876 ; 5.461,0.394 5.969,0.394 5.969,0.902 5.461,0.902 5.461,0.394 ; 6.731,-0.876 6.731,-0.368 7.239,-0.368 7.239,-0.876 6.731,-0.876 ; 6.731,0.394 7.239,0.394 7.239,0.902 6.731,0.902 6.731,0.394 ; 8.001,-0.876 8.001,-0.368 8.509,-0.368 8.509,-0.876 8.001,-0.876 ; 8.001,0.394 8.509,0.394 8.509,0.902 8.001,0.902 8.001,0.394
Mechanical 15:
  circle w0.05: c0,0.013 r0.35
  lines w0.05: -0.5,0.013 0.5,0.013 ; 0,-0.487 0,0.513
3D body: height 4.67, standoff 0, extent 1.27,-2.387 2.54,2.413
3D body: height 4.67, standoff 0, extent 0,-2.387 1.27,2.413
3D body: height 4.67, standoff 0, extent -1.27,-2.387 0,2.413
3D body: height 4.67, standoff 0, extent -2.54,-2.387 -1.27,2.413
3D body: height 4.67, standoff 0, extent -3.81,-2.387 -2.54,2.413
3D body: height 4.67, standoff 0, extent -5.08,-2.387 -3.81,2.413
3D body: height 4.67, standoff 0, extent -6.35,-2.387 -5.08,2.413
3D body: height 4.67, standoff 0, extent -7.62,-2.387 -6.35,2.413
3D body: height 4.67, standoff 0, extent -9.09,-2.387 -7.62,2.413
3D body: height 4.67, standoff 0, extent 7.62,-2.387 9.09,2.413
3D body: height 4.67, standoff 0, extent 2.54,-2.387 3.81,2.413
3D body: height 4.67, standoff 0, extent 3.81,-2.387 5.08,2.413
3D body: height 4.67, standoff 0, extent 5.08,-2.387 6.35,2.413
3D body: height 4.67, standoff 0, extent 6.35,-2.387 7.62,2.413

## HDR1.27-M-LS-2x15P [mm] "双排贴片排母，脚距：1.27mm"
pads (30):
  rect 0.8x1.5 smd: 1(-8.89,1.918) 2(-8.89,-1.892) 3(-7.62,1.918) 4(-7.62,-1.892) 5(-6.35,1.918) 6(-6.35,-1.892) 7(-5.08,1.918) 8(-5.08,-1.892) 9(-3.81,1.918) 10(-3.81,-1.892) 11(-2.54,1.918) 12(-2.54,-1.892) 13(-1.27,1.918) 14(-1.27,-1.892) 15(0,1.918) 16(0,-1.892) 17(1.27,1.918) 18(1.27,-1.892) 19(2.54,1.918) 20(2.54,-1.892) 21(3.81,1.918) 22(3.81,-1.892) 23(5.08,1.918) 24(5.08,-1.892) 25(6.35,1.918) 26(6.35,-1.892) 27(7.62,1.918) 28(7.62,-1.892) 29(8.89,1.918) 30(8.89,-1.892)
Top Overlay:
  lines w0.254: -8.255,-1.689 -8.255,1.689 ; -6.985,-1.689 -6.985,1.689 ; -5.715,-1.689 -5.715,1.689 ; -4.445,-1.689 -4.445,1.689 ; -3.175,-1.689 -3.175,1.689 ; -1.905,-1.689 -1.905,1.689 ; -0.635,-1.689 -0.635,1.689 ; 0.635,-1.689 0.635,1.689 ; 1.905,-1.689 1.905,1.689 ; 3.175,-1.689 3.175,1.689 ; 4.445,-1.689 4.445,1.689 ; 5.715,-1.689 5.715,1.689 ; 6.985,-1.689 6.985,1.689 ; 8.255,-1.689 8.255,1.689 ; -9.855,-1.689 9.855,-1.689 9.855,1.689 -9.855,1.689 -9.855,-1.689 ; -9.144,-0.876 -9.144,-0.368 -8.636,-0.368 -8.636,-0.876 -9.144,-0.876 ; -9.144,0.394 -8.636,0.394 -8.636,0.902 -9.144,0.902 -9.144,0.394 ; -7.874,-0.876 -7.366,-0.876 -7.366,-0.368 -7.874,-0.368 -7.874,-0.876 ; -7.874,0.394 -7.874,0.902 -7.366,0.902 -7.366,0.394 -7.874,0.394 ; -6.604,-0.876 -6.096,-0.876 -6.096,-0.368 -6.604,-0.368 -6.604,-0.876 ; -6.604,0.394 -6.604,0.902 -6.096,0.902 -6.096,0.394 -6.604,0.394 ; -5.334,-0.876 -4.826,-0.876 -4.826,-0.368 -5.334,-0.368 -5.334,-0.876 ; -5.334,0.394 -5.334,0.902 -4.826,0.902 -4.826,0.394 -5.334,0.394 ; -4.064,-0.876 -3.556,-0.876 -3.556,-0.368 -4.064,-0.368 -4.064,-0.876 ; -4.064,0.394 -4.064,0.902 -3.556,0.902 -3.556,0.394 -4.064,0.394 ; -2.794,-0.876 -2.286,-0.876 -2.286,-0.368 -2.794,-0.368 -2.794,-0.876 ; -2.794,0.394 -2.794,0.902 -2.286,0.902 -2.286,0.394 -2.794,0.394 ; -1.524,-0.876 -1.016,-0.876 -1.016,-0.368 -1.524,-0.368 -1.524,-0.876 ; -1.524,0.394 -1.524,0.902 -1.016,0.902 -1.016,0.394 -1.524,0.394 ; -0.254,-0.876 0.254,-0.876 0.254,-0.368 -0.254,-0.368 -0.254,-0.876 ; -0.254,0.394 -0.254,0.902 0.254,0.902 0.254,0.394 -0.254,0.394 ; 1.016,-0.876 1.524,-0.876 1.524,-0.368 1.016,-0.368 1.016,-0.876 ; 1.016,0.394 1.016,0.902 1.524,0.902 1.524,0.394 1.016,0.394 ; 2.286,-0.876 2.794,-0.876 2.794,-0.368 2.286,-0.368 2.286,-0.876 ; 2.286,0.394 2.286,0.902 2.794,0.902 2.794,0.394 2.286,0.394 ; 3.556,-0.876 4.064,-0.876 4.064,-0.368 3.556,-0.368 3.556,-0.876 ; 3.556,0.394 3.556,0.902 4.064,0.902 4.064,0.394 3.556,0.394 ; 4.826,-0.876 5.334,-0.876 5.334,-0.368 4.826,-0.368 4.826,-0.876 ; 4.826,0.394 4.826,0.902 5.334,0.902 5.334,0.394 4.826,0.394 ; 6.096,-0.876 6.604,-0.876 6.604,-0.368 6.096,-0.368 6.096,-0.876 ; 6.096,0.394 6.096,0.902 6.604,0.902 6.604,0.394 6.096,0.394 ; 7.366,-0.876 7.874,-0.876 7.874,-0.368 7.366,-0.368 7.366,-0.876 ; 7.366,0.394 7.366,0.902 7.874,0.902 7.874,0.394 7.366,0.394 ; 8.636,-0.876 9.144,-0.876 9.144,-0.368 8.636,-0.368 8.636,-0.876 ; 8.636,0.394 8.636,0.902 9.144,0.902 9.144,0.394 8.636,0.394
Mechanical 15:
  circle w0.05: c0,0.013 r0.35
  lines w0.05: -0.5,0.013 0.5,0.013 ; 0,-0.487 0,0.513
3D body: height 4.67, standoff 0, extent 0.635,-2.387 1.905,2.413
3D body: height 4.67, standoff 0, extent -0.635,-2.387 0.635,2.413
3D body: height 4.67, standoff 0, extent -1.905,-2.387 -0.635,2.413
3D body: height 4.67, standoff 0, extent -3.175,-2.387 -1.905,2.413
3D body: height 4.67, standoff 0, extent -4.445,-2.387 -3.175,2.413
3D body: height 4.67, standoff 0, extent -5.715,-2.387 -4.445,2.413
3D body: height 4.67, standoff 0, extent -6.985,-2.387 -5.715,2.413
3D body: height 4.67, standoff 0, extent -8.255,-2.387 -6.985,2.413
3D body: height 4.67, standoff 0, extent -9.725,-2.387 -8.255,2.413
3D body: height 4.67, standoff 0, extent 8.255,-2.387 9.725,2.413
3D body: height 4.67, standoff 0, extent 1.905,-2.387 3.175,2.413
3D body: height 4.67, standoff 0, extent 3.175,-2.387 4.445,2.413
3D body: height 4.67, standoff 0, extent 4.445,-2.387 5.715,2.413
3D body: height 4.67, standoff 0, extent 5.715,-2.387 6.985,2.413
3D body: height 4.67, standoff 0, extent 6.985,-2.387 8.255,2.413

## HDR1.27-M-LS-2x16P [mm] "双排贴片排母，脚距：1.27mm"
pads (32):
  rect 0.8x1.5 smd: 1(-9.525,1.905) 2(-9.525,-1.905) 3(-8.255,1.905) 4(-8.255,-1.905) 5(-6.985,1.905) 6(-6.985,-1.905) 7(-5.715,1.905) 8(-5.715,-1.905) 9(-4.445,1.905) 10(-4.445,-1.905) 11(-3.175,1.905) 12(-3.175,-1.905) 13(-1.905,1.905) 14(-1.905,-1.905) 15(-0.635,1.905) 16(-0.635,-1.905) 17(0.635,1.905) 18(0.635,-1.905) 19(1.905,1.905) 20(1.905,-1.905) 21(3.175,1.905) 22(3.175,-1.905) 23(4.445,1.905) 24(4.445,-1.905) 25(5.715,1.905) 26(5.715,-1.905) 27(6.985,1.905) 28(6.985,-1.905) 29(8.255,1.905) 30(8.255,-1.905) 31(9.525,1.905) 32(9.525,-1.905)
Top Overlay:
  lines w0.254: -8.89,-1.702 -8.89,1.676 ; -7.62,-1.702 -7.62,1.676 ; -6.35,-1.702 -6.35,1.676 ; -5.08,-1.702 -5.08,1.676 ; -3.81,-1.702 -3.81,1.676 ; -2.54,-1.702 -2.54,1.676 ; -1.27,-1.702 -1.27,1.676 ; 0,-1.702 0,1.676 ; 1.27,-1.702 1.27,1.676 ; 2.54,-1.702 2.54,1.676 ; 3.81,-1.702 3.81,1.676 ; 5.08,-1.702 5.08,1.676 ; 6.35,-1.702 6.35,1.676 ; 7.62,-1.702 7.62,1.676 ; 8.89,-1.702 8.89,1.676 ; -10.49,-1.702 -10.49,1.676 10.49,1.676 10.49,-1.702 -10.49,-1.702 ; -9.779,-0.889 -9.271,-0.889 -9.271,-0.381 -9.779,-0.381 -9.779,-0.889 ; -9.779,0.381 -9.779,0.889 -9.271,0.889 -9.271,0.381 -9.779,0.381 ; -8.509,-0.889 -8.509,-0.381 -8.001,-0.381 -8.001,-0.889 -8.509,-0.889 ; -8.509,0.381 -8.001,0.381 -8.001,0.889 -8.509,0.889 -8.509,0.381 ; -7.239,-0.889 -7.239,-0.381 -6.731,-0.381 -6.731,-0.889 -7.239,-0.889 ; -7.239,0.381 -6.731,0.381 -6.731,0.889 -7.239,0.889 -7.239,0.381 ; -5.969,-0.889 -5.969,-0.381 -5.461,-0.381 -5.461,-0.889 -5.969,-0.889 ; -5.969,0.381 -5.461,0.381 -5.461,0.889 -5.969,0.889 -5.969,0.381 ; -4.699,-0.889 -4.699,-0.381 -4.191,-0.381 -4.191,-0.889 -4.699,-0.889 ; -4.699,0.381 -4.191,0.381 -4.191,0.889 -4.699,0.889 -4.699,0.381 ; -3.429,-0.889 -3.429,-0.381 -2.921,-0.381 -2.921,-0.889 -3.429,-0.889 ; -3.429,0.381 -2.921,0.381 -2.921,0.889 -3.429,0.889 -3.429,0.381 ; -2.159,-0.889 -2.159,-0.381 -1.651,-0.381 -1.651,-0.889 -2.159,-0.889 ; -2.159,0.381 -1.651,0.381 -1.651,0.889 -2.159,0.889 -2.159,0.381 ; -0.889,-0.889 -0.889,-0.381 -0.381,-0.381 -0.381,-0.889 -0.889,-0.889 ; -0.889,0.381 -0.381,0.381 -0.381,0.889 -0.889,0.889 -0.889,0.381 ; 0.381,-0.889 0.381,-0.381 0.889,-0.381 0.889,-0.889 0.381,-0.889 ; 0.381,0.381 0.889,0.381 0.889,0.889 0.381,0.889 0.381,0.381 ; 1.651,-0.889 1.651,-0.381 2.159,-0.381 2.159,-0.889 1.651,-0.889 ; 1.651,0.381 2.159,0.381 2.159,0.889 1.651,0.889 1.651,0.381 ; 2.921,-0.889 2.921,-0.381 3.429,-0.381 3.429,-0.889 2.921,-0.889 ; 2.921,0.381 3.429,0.381 3.429,0.889 2.921,0.889 2.921,0.381 ; 4.191,-0.889 4.191,-0.381 4.699,-0.381 4.699,-0.889 4.191,-0.889 ; 4.191,0.381 4.699,0.381 4.699,0.889 4.191,0.889 4.191,0.381 ; 5.461,-0.889 5.461,-0.381 5.969,-0.381 5.969,-0.889 5.461,-0.889 ; 5.461,0.381 5.969,0.381 5.969,0.889 5.461,0.889 5.461,0.381 ; 6.731,-0.889 6.731,-0.381 7.239,-0.381 7.239,-0.889 6.731,-0.889 ; 6.731,0.381 7.239,0.381 7.239,0.889 6.731,0.889 6.731,0.381 ; 8.001,-0.889 8.001,-0.381 8.509,-0.381 8.509,-0.889 8.001,-0.889 ; 8.001,0.381 8.509,0.381 8.509,0.889 8.001,0.889 8.001,0.381 ; 9.271,-0.889 9.271,-0.381 9.779,-0.381 9.779,-0.889 9.271,-0.889 ; 9.271,0.381 9.779,0.381 9.779,0.889 9.271,0.889 9.271,0.381
Mechanical 15:
  circle w0.05: c0,0 r0.35
  lines w0.05: -0.5,0 0.5,0 ; 0,-0.5 0,0.5
3D body: height 4.67, standoff 0, extent 0,-2.4 1.27,2.4
3D body: height 4.67, standoff 0, extent -1.27,-2.4 0,2.4
3D body: height 4.67, standoff 0, extent -2.54,-2.4 -1.27,2.4
3D body: height 4.67, standoff 0, extent -3.81,-2.4 -2.54,2.4
3D body: height 4.67, standoff 0, extent -5.08,-2.4 -3.81,2.4
3D body: height 4.67, standoff 0, extent -6.35,-2.4 -5.08,2.4
3D body: height 4.67, standoff 0, extent -7.62,-2.4 -6.35,2.4
3D body: height 4.67, standoff 0, extent -8.89,-2.4 -7.62,2.4
3D body: height 4.67, standoff 0, extent -10.36,-2.4 -8.89,2.4
3D body: height 4.67, standoff 0, extent 8.89,-2.4 10.36,2.4
3D body: height 4.67, standoff 0, extent 1.27,-2.4 2.54,2.4
3D body: height 4.67, standoff 0, extent 2.54,-2.4 3.81,2.4
3D body: height 4.67, standoff 0, extent 3.81,-2.4 5.08,2.4
3D body: height 4.67, standoff 0, extent 5.08,-2.4 6.35,2.4
3D body: height 4.67, standoff 0, extent 6.35,-2.4 7.62,2.4
3D body: height 4.67, standoff 0, extent 7.62,-2.4 8.89,2.4

## HDR1.27-M-LS-2x17P [mm] "双排贴片排母，脚距：1.27mm"
pads (34):
  rect 0.8x1.5 smd: 1(-10.16,1.905) 2(-10.16,-1.905) 3(-8.89,1.905) 4(-8.89,-1.905) 5(-7.62,1.905) 6(-7.62,-1.905) 7(-6.35,1.905) 8(-6.35,-1.905) 9(-5.08,1.905) 10(-5.08,-1.905) 11(-3.81,1.905) 12(-3.81,-1.905) 13(-2.54,1.905) 14(-2.54,-1.905) 15(-1.27,1.905) 16(-1.27,-1.905) 17(0,1.905) 18(0,-1.905) 19(1.27,1.905) 20(1.27,-1.905) 21(2.54,1.905) 22(2.54,-1.905) 23(3.81,1.905) 24(3.81,-1.905) 25(5.08,1.905) 26(5.08,-1.905) 27(6.35,1.905) 28(6.35,-1.905) 29(7.62,1.905) 30(7.62,-1.905) 31(8.89,1.905) 32(8.89,-1.905) 33(10.16,1.905) 34(10.16,-1.905)
Top Overlay:
  drawing of 156 lines, arcs and shapes, not listed
Mechanical 15:
  circle w0.05: c0,0 r0.35
  lines w0.05: -0.5,0 0.5,0 ; 0,-0.5 0,0.5
3D body: height 4.67, standoff 0, extent 9.525,-2.4 10.995,2.4
3D body: height 4.67, standoff 0, extent -10.995,-2.4 -9.525,2.4
3D body: height 4.67, standoff 0, extent -9.525,-2.4 -8.255,2.4
3D body: height 4.67, standoff 0, extent -8.255,-2.4 -6.985,2.4
3D body: height 4.67, standoff 0, extent -6.985,-2.4 -5.715,2.4
3D body: height 4.67, standoff 0, extent -5.715,-2.4 -4.445,2.4
3D body: height 4.67, standoff 0, extent -4.445,-2.4 -3.175,2.4
3D body: height 4.67, standoff 0, extent -3.175,-2.4 -1.905,2.4
3D body: height 4.67, standoff 0, extent -1.905,-2.4 -0.635,2.4
3D body: height 4.67, standoff 0, extent -0.635,-2.4 0.635,2.4
3D body: height 4.67, standoff 0, extent 0.635,-2.4 1.905,2.4
3D body: height 4.67, standoff 0, extent 1.905,-2.4 3.175,2.4
3D body: height 4.67, standoff 0, extent 3.175,-2.4 4.445,2.4
3D body: height 4.67, standoff 0, extent 4.445,-2.4 5.715,2.4
3D body: height 4.67, standoff 0, extent 5.715,-2.4 6.985,2.4
3D body: height 4.67, standoff 0, extent 6.985,-2.4 8.255,2.4
3D body: height 4.67, standoff 0, extent 8.255,-2.4 9.525,2.4

## HDR1.27-M-LS-2x18P [mm] "双排贴片排母，脚距：1.27mm"
pads (36):
  rect 0.8x1.5 smd: 1(-10.795,1.905) 2(-10.795,-1.905) 3(-9.525,1.905) 4(-9.525,-1.905) 5(-8.255,1.905) 6(-8.255,-1.905) 7(-6.985,1.905) 8(-6.985,-1.905) 9(-5.715,1.905) 10(-5.715,-1.905) 11(-4.445,1.905) 12(-4.445,-1.905) 13(-3.175,1.905) 14(-3.175,-1.905) 15(-1.905,1.905) 16(-1.905,-1.905) 17(-0.635,1.905) 18(-0.635,-1.905) 19(0.635,1.905) 20(0.635,-1.905) 21(1.905,1.905) 22(1.905,-1.905) 23(3.175,1.905) 24(3.175,-1.905) 25(4.445,1.905) 26(4.445,-1.905) 27(5.715,1.905) 28(5.715,-1.905) 29(6.985,1.905) 30(6.985,-1.905) 31(8.255,1.905) 32(8.255,-1.905) 33(9.525,1.905) 34(9.525,-1.905) 35(10.795,1.905) 36(10.795,-1.905)
Top Overlay:
  drawing of 165 lines, arcs and shapes, not listed
Mechanical 15:
  circle w0.05: c0,0 r0.35
  lines w0.05: -0.5,0 0.5,0 ; 0,-0.5 0,0.5
3D body: height 4.67, standoff 0, extent 10.16,-2.4 11.63,2.4
3D body: height 4.67, standoff 0, extent -11.63,-2.4 -10.16,2.4
3D body: height 4.67, standoff 0, extent -10.16,-2.4 -8.89,2.4
3D body: height 4.67, standoff 0, extent -8.89,-2.4 -7.62,2.4
3D body: height 4.67, standoff 0, extent -7.62,-2.4 -6.35,2.4
3D body: height 4.67, standoff 0, extent -6.35,-2.4 -5.08,2.4
3D body: height 4.67, standoff 0, extent -5.08,-2.4 -3.81,2.4
3D body: height 4.67, standoff 0, extent -3.81,-2.4 -2.54,2.4
3D body: height 4.67, standoff 0, extent -2.54,-2.4 -1.27,2.4
3D body: height 4.67, standoff 0, extent -1.27,-2.4 0,2.4
3D body: height 4.67, standoff 0, extent 0,-2.4 1.27,2.4
3D body: height 4.67, standoff 0, extent 1.27,-2.4 2.54,2.4
3D body: height 4.67, standoff 0, extent 2.54,-2.4 3.81,2.4
3D body: height 4.67, standoff 0, extent 3.81,-2.4 5.08,2.4
3D body: height 4.67, standoff 0, extent 5.08,-2.4 6.35,2.4
3D body: height 4.67, standoff 0, extent 6.35,-2.4 7.62,2.4
3D body: height 4.67, standoff 0, extent 7.62,-2.4 8.89,2.4
3D body: height 4.67, standoff 0, extent 8.89,-2.4 10.16,2.4